# Altium footprint library LEMO THD_OLD.PcbLib: 54 footprints (part 3 of 4)
Each footprint in its own frame and in the unit in brackets; x right, y up, seen from the top. Pads: shape width x height; smd on the part's side, far side on the other; paste and mask are expansions set on the pad; w line width, h text height; cw(c..) or ccw(c..) is an arc to the next point about the centre after c.
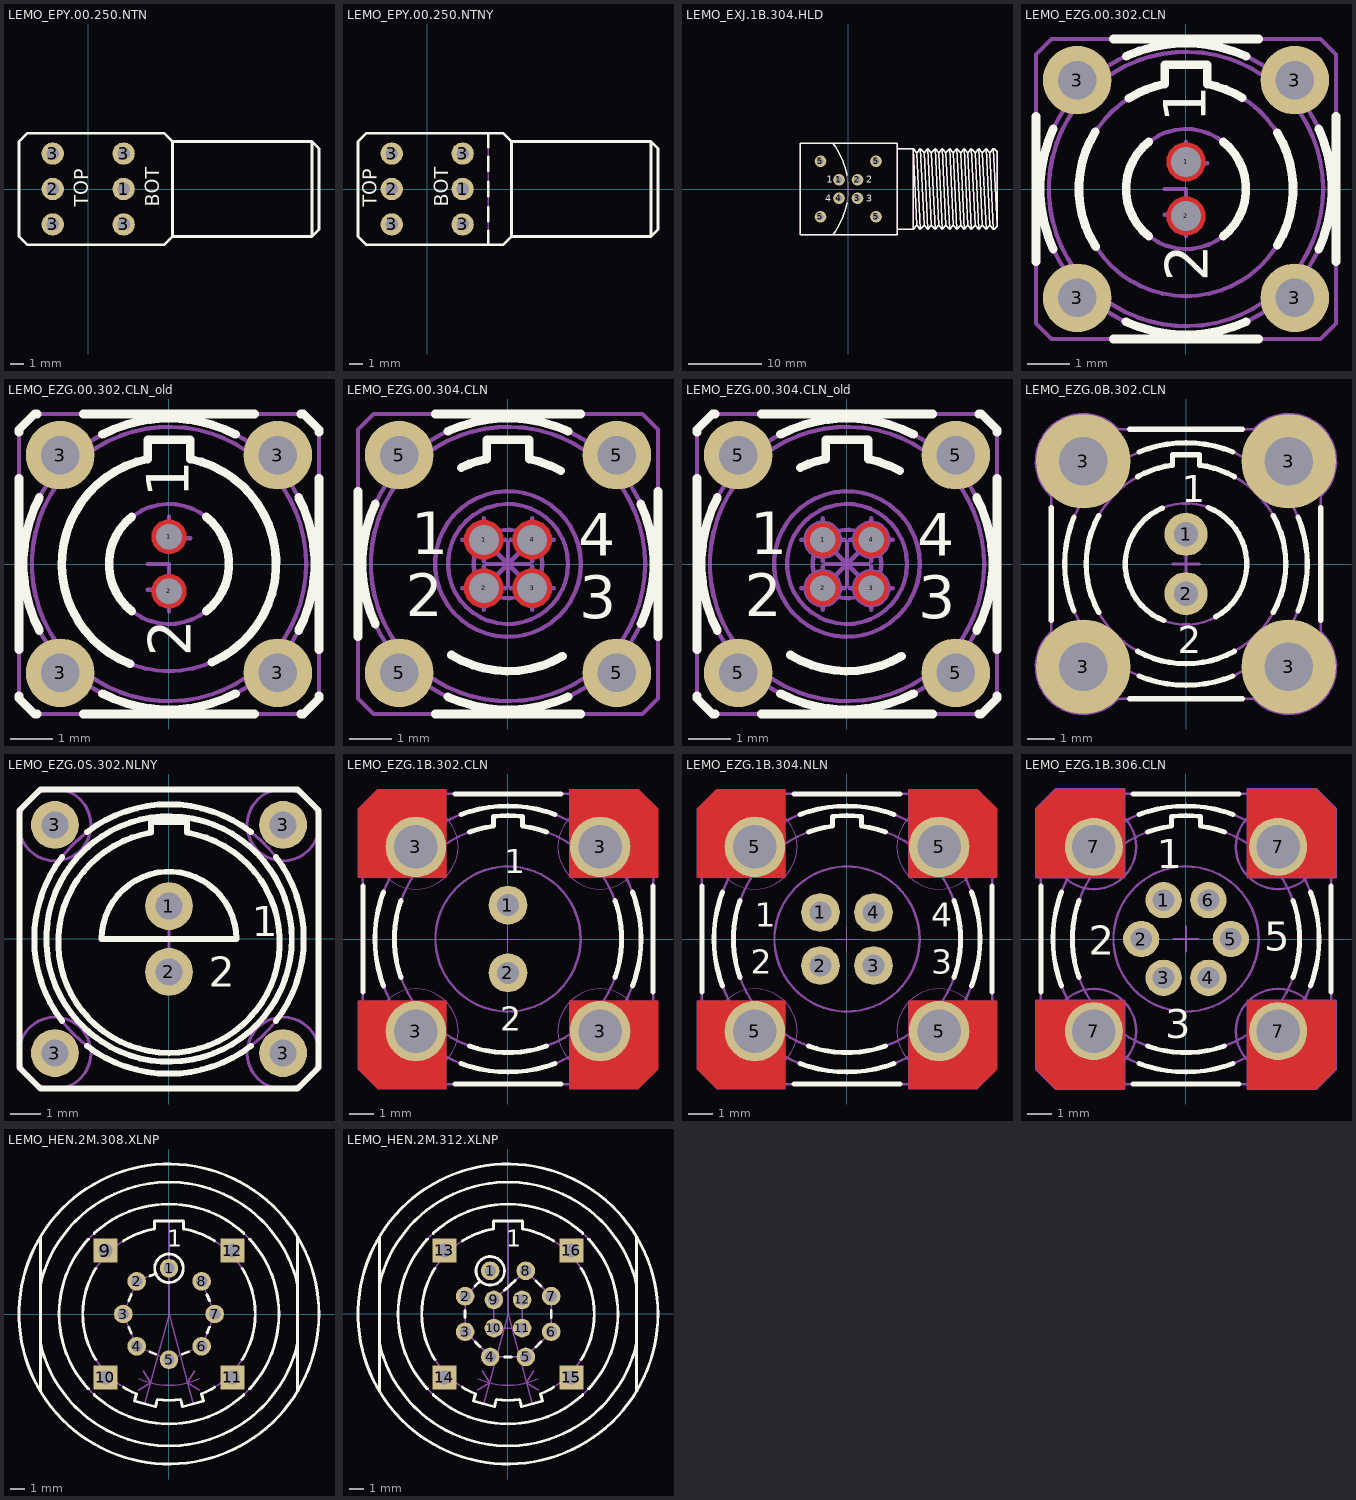
[diagram p2: the footprints below, top view; thin cyan lines are the x and y axes]

## LEMO_EPY.00.250.NTN [mm] "Dual 50 ohms Size 00 Coaxial Elbow Sockets (90°)"
height 14.8
pads (6):
  round 1.6 hole 0.9: 1(2.54,0) 2(-2.54,0) 3(-2.54,-2.54) 3(-2.54,2.54) 3(2.54,-2.54) 3(2.54,2.54)
Top Overlay:
  lines w0.2: 6.04,-3.4 16.04,-3.4 ; 6.04,-3.4 6.04,3.4 ; 6.04,-3.4 5.44,-4 -4.36,-4 -4.96,-3.4 -4.96,3.4 -4.36,4 5.44,4 6.04,3.4 ; 6.04,3.4 16.04,3.4 ; 16.04,-3.4 16.04,3.4 ; 16.04,-3.4 16.54,-2.9 16.54,2.9 16.04,3.4
  text "TOP" at 0,-1.27 h1
  text "BOT" at 5.08,-1.27 h1
Mechanical 14:
  lines w0.1: 6.04,-3.4 16.04,-3.4 ; 6.04,-3.4 6.04,3.4 ; 6.04,-3.4 5.44,-4 -4.36,-4 -4.96,-3.4 -4.96,3.4 -4.36,4 5.44,4 6.04,3.4 ; 6.04,3.4 16.04,3.4 ; 16.04,-3.4 16.04,3.4 ; 16.04,-3.4 16.54,-2.9 16.54,2.9 16.04,3.4
  text "TOP" at 0,-1.27 h1
  text "BOT" at 5.08,-1.27 h1
3D body "LEMO_EPY.00.250.NTNY.stp": height 13.7, standoff -3, extent -4.96,-4 16.54,4

## LEMO_EPY.00.250.NTNY [mm] "Dual 50 ohms Low Profile Size 00 Coaxial Elbow Sockets (90°)"
height 13.7
pads (6):
  round 1.6 hole 0.9: 1(2.54,0) 2(-2.54,0) 3(-2.54,-2.54) 3(-2.54,2.54) 3(2.54,-2.54) 3(2.54,2.54)
Top Overlay:
  lines w0.2: 4.37,-4 4.37,-3 ; 4.37,-2.318 4.37,-1.318 ; 4.37,-0.5 4.37,0.5 ; 4.37,1.318 4.37,2.318 ; 4.37,3 4.37,4 ; 6.04,-3.4 5.44,-4 -4.36,-4 -4.96,-3.4 -4.96,3.4 -4.36,4 5.44,4 6.04,3.4 ; 6.04,-3.4 6.04,3.4 ; 6.04,-3.4 16.04,-3.4 ; 6.04,3.4 16.04,3.4 ; 16.04,-3.4 16.54,-2.9 16.54,2.9 16.04,3.4 ; 16.04,-3.4 16.04,3.4
  text "BOT" at 1.51,-1.27 h1
  text "TOP" at -3.6,-1.27 h1
Mechanical 14:
  lines w0.1: 4.37,-4 4.37,4 ; 6.04,-3.4 5.44,-4 -4.36,-4 -4.96,-3.4 -4.96,3.4 -4.36,4 5.44,4 6.04,3.4 ; 6.04,-3.4 6.04,3.4 ; 6.04,-3.4 16.04,-3.4 ; 6.04,3.4 16.04,3.4 ; 16.04,-3.4 16.54,-2.9 16.54,2.9 16.04,3.4 ; 16.04,-3.4 16.04,3.4
  text "BOT" at 1.51,-1.27 h1
  text "TOP" at -3.6,-1.27 h1
3D body "LEMO_EPY.00.250.NTNY.stp": height 13.7, standoff -3, extent -4.96,-4 16.54,4

## LEMO_EXJ.1B.304.HLD [mm] "Elbow Socket (90°) With 4 Male Contacts For PCB And Keys (J), Serie 1B"
height 14
pads (8):
  round 1.6 hole 0.9: 1(-1.27,1.27) 2(1.27,1.27) 3(1.27,-1.27) 4(-1.27,-1.27) 5(-3.81,-3.81) 5(-3.81,3.81) 5(3.81,-3.81) 5(3.81,3.81)
Top Overlay:
  lines w0.2: -2.132,-6.3 ccw(c-10.375,0) -0.169,-1.861 ; -2.132,6.3 cw(c-10.375,0) -0.169,1.861 ; 6.71,-5.5 8.91,-5.5 ; 6.71,5.5 8.91,5.5 ; 20.41,-5 19.91,5.5 ; 8.91,-5.5 8.91,5.5 ; 8.91,-5.5 9.41,-5 ; 8.91,5.5 9.41,-5 ; 8.91,5.5 9.41,5 ; 9.41,-5 9.91,-5.5 ; 9.41,5 9.91,-5.5 ; 9.41,5 9.91,5.5 ; 9.91,-5.5 10.41,-5 ; 9.91,5.5 10.41,-5 ; 9.91,5.5 10.41,5 ; 10.41,-5 10.91,-5.5 ; 10.41,5 10.91,-5.5 ; 10.41,5 10.91,5.5 ; 10.91,-5.5 11.41,-5 ; 10.91,5.5 11.41,-5 ; 10.91,5.5 11.41,5 ; 11.41,-5 11.91,-5.5 ; 11.41,5 11.91,-5.5 ; 11.41,5 11.91,5.5 ; 11.91,-5.5 12.41,-5 ; 11.91,5.5 12.41,-5 ; 11.91,5.5 12.41,5 ; 12.41,-5 12.91,-5.5 ; 12.41,5 12.91,-5.5 ; 12.41,5 12.91,5.5 ; 12.91,-5.5 13.41,-5 ; 12.91,5.5 13.41,-5 ; 12.91,5.5 13.41,5 ; 13.41,-5 13.91,-5.5 ; 13.41,5 13.91,-5.5 ; 13.41,5 13.91,5.5 ; 13.91,-5.5 14.41,-5 ; 13.91,5.5 14.41,-5 ; 13.91,5.5 14.41,5 ; 14.41,-5 14.91,-5.5 ; 14.41,5 14.91,-5.5 ; 14.41,5 14.91,5.5 ; 14.91,-5.5 15.41,-5 ; 14.91,5.5 15.41,-5 ; 14.91,5.5 15.41,5 ; 15.41,-5 15.91,-5.5 ; 15.41,5 15.91,-5.5 ; 15.41,5 15.91,5.5 ; 15.91,-5.5 16.41,-5 ; 15.91,5.5 16.41,-5 ; 15.91,5.5 16.41,5 ; 16.41,-5 16.91,-5.5 ; 16.41,5 16.91,-5.5 ; 16.41,5 16.91,5.5 ; 16.91,-5.5 17.41,-5 ; 16.91,5.5 17.41,-5 ; 16.91,5.5 17.41,5 ; 17.41,-5 17.91,-5.5 ; 17.41,5 17.91,-5.5 ; 17.41,5 17.91,5.5 ; 17.91,-5.5 18.41,-5 ; 17.91,5.5 18.41,-5 ; 17.91,5.5 18.41,5 ; 18.41,-5 18.91,-5.5 ; 18.41,5 18.91,-5.5 ; 18.41,5 18.91,5.5 ; 18.91,-5.5 19.41,-5 ; 18.91,5.5 19.41,-5 ; 18.91,5.5 19.41,5 ; 19.41,-5 19.91,-5.5 ; 19.41,5 19.91,-5.5 ; 19.41,5 19.91,5.5 ; 19.91,-5.5 20.01,-5.5 20.41,-5.1 20.41,5.1 20.01,5.5 19.91,5.5 ; -6.59,-6.3 -6.59,6.3 6.71,6.3 6.71,-6.3 -6.59,-6.3
  text "3" at 2.477,-1.717 h0.97
  text "4" at -3.12,-1.748 h0.97
  text "2" at 2.48,0.827 h0.97
  text "1" at -2.932,0.827 h0.97
Mechanical 8:
  lines w0.1: -4.31,-3.81 -3.81,-3.81 ; -4.31,3.81 -3.81,3.81 ; -3.81,-4.31 -3.81,-3.81 ; -3.81,-3.31 -3.81,-3.81 ; -3.81,3.31 -3.81,3.81 ; -3.81,4.31 -3.81,3.81 ; -3.31,-3.81 -3.81,-3.81 ; -3.31,3.81 -3.81,3.81 ; -1.77,-1.27 -1.27,-1.27 ; -1.77,1.27 -1.27,1.27 ; -1.27,-1.77 -1.27,-1.27 ; -1.27,-0.77 -1.27,-1.27 ; -1.27,0.77 -1.27,1.27 ; -1.27,1.77 -1.27,1.27 ; -0.77,-1.27 -1.27,-1.27 ; -0.77,1.27 -1.27,1.27 ; -0.5,0 0,0 ; 0,-0.5 0,0 ; 0,0.5 0,0 ; 0.5,0 0,0 ; 0.77,-1.27 1.27,-1.27 ; 0.77,1.27 1.27,1.27 ; 1.27,-1.77 1.27,-1.27 ; 1.27,-0.77 1.27,-1.27 ; 1.27,0.77 1.27,1.27 ; 1.27,1.77 1.27,1.27 ; 1.77,-1.27 1.27,-1.27 ; 1.77,1.27 1.27,1.27 ; 3.31,-3.81 3.81,-3.81 ; 3.31,3.81 3.81,3.81 ; 3.81,-4.31 3.81,-3.81 ; 3.81,-3.31 3.81,-3.81 ; 3.81,3.31 3.81,3.81 ; 3.81,4.31 3.81,3.81 ; 4.31,-3.81 3.81,-3.81 ; 4.31,3.81 3.81,3.81
Mechanical 14:
  lines w0.1: -2.132,-6.3 ccw(c-10.375,0) -2.132,6.3 ; 6.71,-5.5 8.91,-5.5 ; 6.71,5.5 8.91,5.5 ; 20.41,-5 19.91,5.5 ; 8.91,-5.5 8.91,5.5 ; 8.91,-5.5 9.41,-5 ; 8.91,5.5 9.41,-5 ; 8.91,5.5 9.41,5 ; 9.41,-5 9.91,-5.5 ; 9.41,5 9.91,-5.5 ; 9.41,5 9.91,5.5 ; 9.91,-5.5 10.41,-5 ; 9.91,5.5 10.41,-5 ; 9.91,5.5 10.41,5 ; 10.41,-5 10.91,-5.5 ; 10.41,5 10.91,-5.5 ; 10.41,5 10.91,5.5 ; 10.91,-5.5 11.41,-5 ; 10.91,5.5 11.41,-5 ; 10.91,5.5 11.41,5 ; 11.41,-5 11.91,-5.5 ; 11.41,5 11.91,-5.5 ; 11.41,5 11.91,5.5 ; 11.91,-5.5 12.41,-5 ; 11.91,5.5 12.41,-5 ; 11.91,5.5 12.41,5 ; 12.41,-5 12.91,-5.5 ; 12.41,5 12.91,-5.5 ; 12.41,5 12.91,5.5 ; 12.91,-5.5 13.41,-5 ; 12.91,5.5 13.41,-5 ; 12.91,5.5 13.41,5 ; 13.41,-5 13.91,-5.5 ; 13.41,5 13.91,-5.5 ; 13.41,5 13.91,5.5 ; 13.91,-5.5 14.41,-5 ; 13.91,5.5 14.41,-5 ; 13.91,5.5 14.41,5 ; 14.41,-5 14.91,-5.5 ; 14.41,5 14.91,-5.5 ; 14.41,5 14.91,5.5 ; 14.91,-5.5 15.41,-5 ; 14.91,5.5 15.41,-5 ; 14.91,5.5 15.41,5 ; 15.41,-5 15.91,-5.5 ; 15.41,5 15.91,-5.5 ; 15.41,5 15.91,5.5 ; 15.91,-5.5 16.41,-5 ; 15.91,5.5 16.41,-5 ; 15.91,5.5 16.41,5 ; 16.41,-5 16.91,-5.5 ; 16.41,5 16.91,-5.5 ; 16.41,5 16.91,5.5 ; 16.91,-5.5 17.41,-5 ; 16.91,5.5 17.41,-5 ; 16.91,5.5 17.41,5 ; 17.41,-5 17.91,-5.5 ; 17.41,5 17.91,-5.5 ; 17.41,5 17.91,5.5 ; 17.91,-5.5 18.41,-5 ; 17.91,5.5 18.41,-5 ; 17.91,5.5 18.41,5 ; 18.41,-5 18.91,-5.5 ; 18.41,5 18.91,-5.5 ; 18.41,5 18.91,5.5 ; 18.91,-5.5 19.41,-5 ; 18.91,5.5 19.41,-5 ; 18.91,5.5 19.41,5 ; 19.41,-5 19.91,-5.5 ; 19.41,5 19.91,-5.5 ; 19.41,5 19.91,5.5 ; 19.91,-5.5 20.01,-5.5 20.41,-5.1 20.41,5.1 20.01,5.5 19.91,5.5 ; -6.59,-6.3 -6.59,6.3 6.71,6.3 6.71,-6.3 -6.59,-6.3
  text "3" at 2.477,-1.717 h0.97
  text "4" at -3.12,-1.748 h0.97
  text "2" at 2.48,0.827 h0.97
  text "1" at -2.932,0.827 h0.97
3D body "LEMO_EXJ.1B.304.HLD_Part3.stp": height 15.5, standoff -0.5, extent 8.91,-8 12.41,8
3D body "LEMO_EXJ.1B.304.HLD_Part2.stp": height 14.44, standoff 0.56, extent 16.91,-6.942 20.41,6.942
3D body "LEMO_EXJ.1B.304.HLD_Part1.stp": height 14, standoff -3.2, extent -6.59,-6.3 20.41,6.3

## LEMO_EZG.00.302.CLN [mm] "Size 00, Straight Receptacle with 2 Female Contacts and Alignment Key (G)"
height 14
pads (6):
  round 0.2 / inner rrect50% 1.1x1.1 / far side rrect50% 1.1x1.1 hole 0.7 copper offset 0,0.05: 1(0,0.635)
  round 0.2 / inner rrect50% 1.1x1.1 / far side rrect50% 1.1x1.1 hole 0.7 copper offset 0,-0.05: 2(0,-0.635)
  round 1.6 hole 0.9: 3(-2.54,-2.54) 3(-2.54,2.54) 3(2.54,-2.54) 3(2.54,2.54)
Top Layer:
  region: 0,-1.085 -0.09,-1.085 -0.255,-1.016 -0.381,-0.89 -0.45,-0.725 -0.45,-0.635 -0.45,-0.545 -0.381,-0.38 -0.255,-0.254 -0.09,-0.185 0,-0.185 0.09,-0.185 0.255,-0.254 0.381,-0.38 0.45,-0.545 0.45,-0.635 0.45,-0.725 0.381,-0.89 0.255,-1.016 0.09,-1.085
  region: 0,0.185 -0.09,0.185 -0.255,0.254 -0.381,0.38 -0.45,0.545 -0.45,0.635 -0.45,0.725 -0.381,0.89 -0.255,1.016 -0.09,1.085 0,1.085 0.09,1.085 0.255,1.016 0.381,0.89 0.45,0.725 0.45,0.635 0.45,0.545 0.381,0.38 0.255,0.254 0.09,0.185
Top Overlay:
  lines w0.2: -3.5,-1.7 -3.5,1.7 ; -3.099,-1.399 cw(c0,0) -3.099,1.399 ; -2.114,1.335 ccw(c0,0) -2.109,-1.342 ; -1.7,-3.5 1.7,-3.5 ; -1.7,3.5 1.7,3.5 ; -1.399,-3.099 ccw(c0,0) 1.399,-3.099 ; -1.391,3.102 cw(c0,0) 1.399,3.099 ; -1.335,2.114 cw(c0,0) -0.5,2.449 -0.5,2.9 0.5,2.9 0.5,2.449 cw(c0,0) 1.316,2.126 ; -0.866,-1.1 cw(c0,0) -0.866,1.1 ; 0.866,-1.1 ccw(c0,0) 0.866,1.1 ; 2.126,-1.316 ccw(c0,0) 2.126,1.316 ; 3.099,-1.399 ccw(c0,0) 3.099,1.399 ; 3.5,-1.7 3.5,1.7
  text "2" at 0.508,-2.159 h1
  text "1" at 0.457,1.548 h1
Mechanical 8:
  lines w0.1: -3.04,-2.54 -2.54,-2.54 -2.54,-3.04 ; -3.04,2.54 -2.54,2.54 -2.54,3.04 ; -0.5,-0.6 0,-0.6 0,-1.1 ; -0.5,0 0,0 0,-0.5 ; 0,1.1 0,0.6 0.5,0.6 ; 2.54,-3.04 2.54,-2.54 3.04,-2.54 ; 2.54,3.04 2.54,2.54 3.04,2.54
Mechanical 14:
  circle w0.1: c0,0 r1.4
  circle w0.1: c0,0 r3.2
  circle w0.1: c0,0 r3.4
  lines w0.1: -3.5,-3.137 -3.5,3.137 -3.137,3.5 3.137,3.5 3.5,3.137 3.5,-3.137 3.137,-3.5 -3.137,-3.5 -3.5,-3.137 ; -0.5,2.449 ccw(c0,0) 0.5,2.449 0.5,2.9 -0.5,2.9 -0.5,2.449
  text "2" at 0.508,-2.159 h1
  text "1" at 0.457,1.548 h1
3D body "LEMO_EZG.00.302.CLN.stp": height 14, standoff -3, extent -3.5,-3.5 3.501,3.502

## LEMO_EZG.00.302.CLN_old [mm] "Size 00, Straight Receptacle with 2 Female Contacts and Alignment Key (G)"
height 14
pads (6):
  round 0.2 / inner rrect50% 1.1x1.1 / far side rrect50% 1.1x1.1 hole 0.6 copper offset 0,0.05: 1(0,0.635)
  round 0.2 / inner rrect50% 1.1x1.1 / far side rrect50% 1.1x1.1 hole 0.6 copper offset 0,-0.05: 2(0,-0.635)
  round 1.6 hole 0.9: 3(-2.54,-2.54) 3(-2.54,2.54) 3(2.54,-2.54) 3(2.54,2.54)
Top Layer:
  region: 0,-1.035 -0.08,-1.035 -0.227,-0.974 -0.339,-0.862 -0.4,-0.715 -0.4,-0.635 -0.4,-0.555 -0.339,-0.408 -0.227,-0.296 -0.08,-0.235 0,-0.235 0.08,-0.235 0.227,-0.296 0.339,-0.408 0.4,-0.555 0.4,-0.635 0.4,-0.715 0.339,-0.862 0.227,-0.974 0.08,-1.035
  region: 0,0.235 -0.08,0.235 -0.227,0.296 -0.339,0.408 -0.4,0.555 -0.4,0.635 -0.4,0.715 -0.339,0.862 -0.227,0.974 -0.08,1.035 0,1.035 0.08,1.035 0.227,0.974 0.339,0.862 0.4,0.715 0.4,0.635 0.4,0.555 0.339,0.408 0.227,0.296 0.08,0.235
Top Overlay:
  lines w0.2: -3.5,-3.077 -3.5,-3.137 -3.137,-3.5 -3.077,-3.5 ; -3.5,-2.003 -3.5,2.003 ; -3.5,3.077 -3.5,3.137 -3.137,3.5 -3.077,3.5 ; -3.025,-1.553 cw(c0,0) -3.025,1.553 ; -2.003,-3.5 2.003,-3.5 ; -2.003,3.5 2.003,3.5 ; -1.553,-3.025 ccw(c0,0) 1.553,-3.025 ; -1.553,3.025 cw(c0,0) 1.553,3.025 ; -0.906,-2.33 cw(c0,0) -0.5,2.449 -0.5,2.9 0.5,2.9 0.5,2.449 cw(c0,0) 1.002,-2.29 ; -0.866,-1.1 cw(c0,0) -0.866,1.1 ; 0.866,-1.1 ccw(c0,0) 0.866,1.1 ; 3.025,-1.553 ccw(c0,0) 3.025,1.553 ; 3.077,-3.5 3.137,-3.5 3.5,-3.137 3.5,-3.077 ; 3.077,3.5 3.137,3.5 3.5,3.137 3.5,3.077 ; 3.5,-2.003 3.5,2.003
  text "1" at 0.457,1.548 h1
  text "2" at 0.508,-2.159 h1
Mechanical 8:
  lines w0.1: -3.04,-2.54 -2.54,-2.54 -2.54,-3.04 ; -3.04,2.54 -2.54,2.54 -2.54,3.04 ; -0.5,-0.6 0,-0.6 0,-1.1 ; -0.5,0 0,0 0,-0.5 ; 0,1.1 0,0.6 0.5,0.6 ; 2.54,-3.04 2.54,-2.54 3.04,-2.54 ; 2.54,3.04 2.54,2.54 3.04,2.54
Mechanical 14:
  circle w0.1: c0,0 r3.4
  circle w0.1: c0,0 r3.2
  circle w0.1: c0,0 r1.4
  lines w0.1: -3.5,-3.137 -3.137,-3.5 3.137,-3.5 3.5,-3.137 3.5,3.137 3.137,3.5 -3.137,3.5 -3.5,3.137 -3.5,-3.137 ; -0.5,2.449 ccw(c0,0) 0.5,2.449 0.5,2.9 -0.5,2.9 -0.5,2.449
  text "1" at 0.457,1.548 h1
  text "2" at 0.508,-2.159 h1
3D body "LEMO_EZG.00.302.CLN.stp": height 14, standoff -3, extent -3.5,-3.5 3.501,3.502

## LEMO_EZG.00.304.CLN [mm] "Size 00, Straight Receptacle with 4 Female Contacts and Alignment Key (G)"
height 14
pads (8):
  round 0.2 / inner rrect50% 1.1x1.1 / far side rrect50% 1.1x1.1 hole 0.7 copper offset -0.1,0.1: 1(-0.566,0.566)
  rrect50% 0.2x0.2 / inner rrect50% 1.1x1.1 / far side rrect50% 1.1x1.1 hole 0.7 copper offset -0.1,-0.1: 2(-0.566,-0.566)
  rrect50% 0.2x0.2 / inner rrect50% 1.1x1.1 / far side rrect50% 1.1x1.1 hole 0.7 copper offset 0.1,-0.1: 3(0.566,-0.566)
  rrect50% 0.2x0.2 / inner rrect50% 1.1x1.1 / far side rrect50% 1.1x1.1 hole 0.7 copper offset 0.1,0.1: 4(0.566,0.566)
  round 1.6 hole 0.9: 5(-2.54,-2.54) 5(-2.54,2.54) 5(2.54,-2.54) 5(2.54,2.54)
Top Layer:
  region: -0.566,0.116 -0.655,0.116 -0.821,0.184 -0.947,0.311 -1.016,0.476 -1.016,0.566 -1.016,0.655 -0.947,0.821 -0.821,0.947 -0.655,1.016 -0.566,1.016 -0.476,1.016 -0.311,0.947 -0.184,0.821 -0.116,0.655 -0.116,0.566 -0.116,0.476 -0.184,0.311 -0.311,0.184 -0.476,0.116
  region: 0.566,0.116 0.476,0.116 0.311,0.184 0.184,0.311 0.116,0.476 0.116,0.566 0.116,0.655 0.184,0.821 0.311,0.947 0.476,1.016 0.566,1.016 0.655,1.016 0.821,0.947 0.947,0.821 1.016,0.655 1.016,0.566 1.016,0.476 0.947,0.311 0.821,0.184 0.655,0.116
  region: -0.566,-1.016 -0.655,-1.016 -0.821,-0.947 -0.947,-0.821 -1.016,-0.655 -1.016,-0.566 -1.016,-0.476 -0.947,-0.311 -0.821,-0.184 -0.655,-0.116 -0.566,-0.116 -0.476,-0.116 -0.311,-0.184 -0.184,-0.311 -0.116,-0.476 -0.116,-0.566 -0.116,-0.655 -0.184,-0.821 -0.311,-0.947 -0.476,-1.016
  region: 0.566,-1.016 0.476,-1.016 0.311,-0.947 0.184,-0.821 0.116,-0.655 0.116,-0.566 0.116,-0.476 0.184,-0.311 0.311,-0.184 0.476,-0.116 0.566,-0.116 0.655,-0.116 0.821,-0.184 0.947,-0.311 1.016,-0.476 1.016,-0.566 1.016,-0.655 0.947,-0.821 0.821,-0.947 0.655,-1.016
Top Overlay:
  lines w0.2: -3.5,-1.7 -3.5,1.7 ; -3.096,-1.404 cw(c0,0) -3.096,1.405 ; -1.7,-3.5 1.7,-3.5 ; -1.7,3.5 1.7,3.5 ; -1.401,-3.098 ccw(c0,0) 1.399,-3.099 ; -1.4,3.098 cw(c0,0) 1.399,3.099 ; -1.319,-2.124 ccw(c0,0) 1.279,-2.148 ; -1.09,2.25 cw(c0,0) -0.5,2.449 -0.5,2.9 0.5,2.9 0.5,2.449 cw(c0,0) 1.235,2.174 ; 3.096,1.405 cw(c0,0) 3.1,-1.398 ; 3.5,-1.7 3.5,1.7
  text "2" at -2.387,-1.217 h1
  text "3" at 1.658,-1.261 h1
  text "4" at 1.638,0.188 h1
  text "1" at -2.262,0.233 h1
Mechanical 8:
  circle w0.1: c0,0 r1.4
  circle w0.1: c0,0 r0.8
  lines w0.1: -3.04,-2.54 -2.54,-2.54 ; -3.04,2.54 -2.54,2.54 ; -2.54,-3.04 -2.54,-2.54 ; -2.54,-2.04 -2.54,-2.54 ; -2.54,2.04 -2.54,2.54 ; -2.54,3.04 -2.54,2.54 ; -2.04,-2.54 -2.54,-2.54 ; -2.04,2.54 -2.54,2.54 ; -1.066,-0.566 -0.566,-0.566 ; -1.066,0.566 -0.566,0.566 ; -0.566,-1.066 -0.566,-0.566 ; -0.566,-0.066 -0.566,-0.566 ; -0.566,0.066 -0.566,0.566 ; -0.566,1.066 -0.566,0.566 ; -0.5,0 0,0 ; -0.066,-0.566 -0.566,-0.566 ; -0.066,0.566 -0.566,0.566 ; 0,-0.5 0,0 ; 0,0.5 0,0 ; 0.066,-0.566 0.566,-0.566 ; 0.066,0.566 0.566,0.566 ; 0.5,0 0,0 ; 0.566,-1.066 0.566,-0.566 ; 0.566,-0.066 0.566,-0.566 ; 0.566,0.066 0.566,0.566 ; 0.566,1.066 0.566,0.566 ; 1.066,-0.566 0.566,-0.566 ; 1.066,0.566 0.566,0.566 ; 2.04,-2.54 2.54,-2.54 ; 2.04,2.54 2.54,2.54 ; 2.54,-3.04 2.54,-2.54 ; 2.54,-2.04 2.54,-2.54 ; 2.54,2.04 2.54,2.54 ; 2.54,3.04 2.54,2.54 ; 3.04,-2.54 2.54,-2.54 ; 3.04,2.54 2.54,2.54 ; -0.566,-0.566 0.566,0.566 ; -0.566,0.566 0.566,-0.566
Mechanical 14:
  circle w0.1: c0,0 r1.7
  circle w0.1: c0,0 r3.4
  circle w0.1: c0,0 r3.2
  circle w0.1: c0.566,0.566 r0.4
  circle w0.1: c0.566,0.566 r0.2
  circle w0.1: c0.566,-0.566 r0.2
  circle w0.1: c0.566,-0.566 r0.4
  circle w0.1: c-0.566,-0.566 r0.2
  circle w0.1: c-0.566,-0.566 r0.4
  circle w0.1: c-0.566,0.566 r0.4
  circle w0.1: c-0.566,0.566 r0.2
  lines w0.1: -1.319,-2.124 ccw(c0,0) 1.279,-2.148 ; -1.09,2.25 cw(c0,0) -0.5,2.449 -0.5,2.9 0.5,2.9 0.5,2.449 cw(c0,0) 1.235,2.174 ; -3.5,-3.137 -3.5,3.137 -3.137,3.5 3.137,3.5 3.5,3.137 3.5,-3.137 3.137,-3.5 -3.137,-3.5 -3.5,-3.137
  text "2" at -2.387,-1.217 h1
  text "3" at 1.658,-1.261 h1
  text "4" at 1.638,0.188 h1
  text "1" at -2.262,0.233 h1
3D body "LEMO_EZG.00.304.CLN.stp": height 14, standoff -3, extent -3.5,-3.5 3.501,3.503

## LEMO_EZG.00.304.CLN_old [mm] "Size 00, Straight Receptacle with 4 Female Contacts and Alignment Key (G)"
height 14
pads (8):
  round 0.2 / inner rrect50% 1.1x1.1 / far side rrect50% 1.1x1.1 hole 0.6 copper offset -0.1,0.1: 1(-0.566,0.566)
  rrect50% 0.2x0.2 / inner rrect50% 1.1x1.1 / far side rrect50% 1.1x1.1 hole 0.6 copper offset -0.1,-0.1: 2(-0.566,-0.566)
  rrect50% 0.2x0.2 / inner rrect50% 1.1x1.1 / far side rrect50% 1.1x1.1 hole 0.6 copper offset 0.1,-0.1: 3(0.566,-0.566)
  rrect50% 0.2x0.2 / inner rrect50% 1.1x1.1 / far side rrect50% 1.1x1.1 hole 0.6 copper offset 0.1,0.1: 4(0.566,0.566)
  round 1.6 hole 0.9: 5(-2.54,-2.54) 5(-2.54,2.54) 5(2.54,-2.54) 5(2.54,2.54)
Top Layer:
  region: -0.566,0.166 -0.645,0.166 -0.792,0.227 -0.905,0.339 -0.966,0.486 -0.966,0.566 -0.966,0.645 -0.905,0.792 -0.792,0.905 -0.645,0.966 -0.566,0.966 -0.486,0.966 -0.339,0.905 -0.227,0.792 -0.166,0.645 -0.166,0.566 -0.166,0.486 -0.227,0.339 -0.339,0.227 -0.486,0.166
  region: 0.566,0.166 0.486,0.166 0.339,0.227 0.227,0.339 0.166,0.486 0.166,0.566 0.166,0.645 0.227,0.792 0.339,0.905 0.486,0.966 0.566,0.966 0.645,0.966 0.792,0.905 0.905,0.792 0.966,0.645 0.966,0.566 0.966,0.486 0.905,0.339 0.792,0.227 0.645,0.166
  region: 0.566,-0.966 0.486,-0.966 0.339,-0.905 0.227,-0.792 0.166,-0.645 0.166,-0.566 0.166,-0.486 0.227,-0.339 0.339,-0.227 0.486,-0.166 0.566,-0.166 0.645,-0.166 0.792,-0.227 0.905,-0.339 0.966,-0.486 0.966,-0.566 0.966,-0.645 0.905,-0.792 0.792,-0.905 0.645,-0.966
  region: -0.566,-0.966 -0.645,-0.966 -0.792,-0.905 -0.905,-0.792 -0.966,-0.645 -0.966,-0.566 -0.966,-0.486 -0.905,-0.339 -0.792,-0.227 -0.645,-0.166 -0.566,-0.166 -0.486,-0.166 -0.339,-0.227 -0.227,-0.339 -0.166,-0.486 -0.166,-0.566 -0.166,-0.645 -0.227,-0.792 -0.339,-0.905 -0.486,-0.966
Bottom Layer:
  region: -0.566,0.166 -0.645,0.166 -0.792,0.227 -0.905,0.339 -0.966,0.486 -0.966,0.566 -0.966,0.645 -0.905,0.792 -0.792,0.905 -0.645,0.966 -0.566,0.966 -0.486,0.966 -0.339,0.905 -0.227,0.792 -0.166,0.645 -0.166,0.566 -0.166,0.486 -0.227,0.339 -0.339,0.227 -0.486,0.166
Top Overlay:
  lines w0.2: -3.5,-3.077 -3.5,-3.137 -3.137,-3.5 -3.077,-3.5 ; -3.5,-2.003 -3.5,2.003 ; -3.5,3.077 -3.5,3.137 -3.137,3.5 -3.077,3.5 ; -3.025,-1.553 cw(c0,0) -3.025,1.553 ; -2.003,-3.5 2.003,-3.5 ; -2.003,3.5 2.003,3.5 ; -1.553,-3.025 ccw(c0,0) 1.553,-3.025 ; -1.553,3.025 cw(c0,0) 1.553,3.025 ; -1.319,-2.124 ccw(c0,0) 1.279,-2.148 ; -1.09,2.25 cw(c0,0) -0.5,2.449 -0.5,2.9 0.5,2.9 0.5,2.449 cw(c0,0) 1.235,2.174 ; 3.025,-1.553 ccw(c0,0) 3.025,1.553 ; 3.077,-3.5 3.137,-3.5 3.5,-3.137 3.5,-3.077 ; 3.077,3.5 3.137,3.5 3.5,3.137 3.5,3.077 ; 3.5,-2.003 3.5,2.003
  text "2" at -2.387,-1.217 h1
  text "3" at 1.658,-1.261 h1
  text "4" at 1.638,0.188 h1
  text "1" at -2.262,0.233 h1
Mechanical 8:
  circle w0.1: c0,0 r1.4
  circle w0.1: c0,0 r0.8
  lines w0.1: -3.04,-2.54 -2.54,-2.54 ; -3.04,2.54 -2.54,2.54 ; -2.54,-3.04 -2.54,-2.54 ; -2.54,-2.04 -2.54,-2.54 ; -2.54,2.04 -2.54,2.54 ; -2.54,3.04 -2.54,2.54 ; -2.04,-2.54 -2.54,-2.54 ; -2.04,2.54 -2.54,2.54 ; -1.066,-0.566 -0.566,-0.566 ; -1.066,0.566 -0.566,0.566 ; -0.566,-1.066 -0.566,-0.566 ; -0.566,-0.066 -0.566,-0.566 ; -0.566,0.066 -0.566,0.566 ; -0.566,1.066 -0.566,0.566 ; -0.5,0 0,0 ; -0.066,-0.566 -0.566,-0.566 ; -0.066,0.566 -0.566,0.566 ; 0,-0.5 0,0 ; 0,0.5 0,0 ; 0.066,-0.566 0.566,-0.566 ; 0.066,0.566 0.566,0.566 ; 0.5,0 0,0 ; 0.566,-1.066 0.566,-0.566 ; 0.566,-0.066 0.566,-0.566 ; 0.566,0.066 0.566,0.566 ; 0.566,1.066 0.566,0.566 ; 1.066,-0.566 0.566,-0.566 ; 1.066,0.566 0.566,0.566 ; 2.04,-2.54 2.54,-2.54 ; 2.04,2.54 2.54,2.54 ; 2.54,-3.04 2.54,-2.54 ; 2.54,-2.04 2.54,-2.54 ; 2.54,2.04 2.54,2.54 ; 2.54,3.04 2.54,2.54 ; 3.04,-2.54 2.54,-2.54 ; 3.04,2.54 2.54,2.54 ; -0.566,-0.566 0.566,0.566 ; -0.566,0.566 0.566,-0.566
Mechanical 14:
  circle w0.1: c0,0 r1.7
  circle w0.1: c0,0 r3.4
  circle w0.1: c0,0 r3.2
  circle w0.1: c0.566,0.566 r0.4
  circle w0.1: c0.566,0.566 r0.2
  circle w0.1: c0.566,-0.566 r0.2
  circle w0.1: c0.566,-0.566 r0.4
  circle w0.1: c-0.566,-0.566 r0.2
  circle w0.1: c-0.566,-0.566 r0.4
  circle w0.1: c-0.566,0.566 r0.4
  circle w0.1: c-0.566,0.566 r0.2
  lines w0.1: -1.319,-2.124 ccw(c0,0) 1.279,-2.148 ; -1.09,2.25 cw(c0,0) -0.5,2.449 -0.5,2.9 0.5,2.9 0.5,2.449 cw(c0,0) 1.235,2.174 ; -3.5,-3.137 -3.5,3.137 -3.137,3.5 3.137,3.5 3.5,3.137 3.5,-3.137 3.137,-3.5 -3.137,-3.5 -3.5,-3.137
  text "2" at -2.387,-1.217 h1
  text "3" at 1.658,-1.261 h1
  text "4" at 1.638,0.188 h1
  text "1" at -2.262,0.233 h1
3D body "LEMO_EZG.00.304.CLN.stp": height 14, standoff -3, extent -3.5,-3.5 3.501,3.503
